# Altium footprint library 集大电协1.5.PcbLib: 273 footprints (part 8 of 18)
Each footprint in its own frame and in the unit in brackets; x right, y up, seen from the top. Pads: shape width x height; smd on the part's side, far side on the other; paste and mask are expansions set on the pad; w line width, h text height; cw(c..) or ccw(c..) is an arc to the next point about the centre after c.
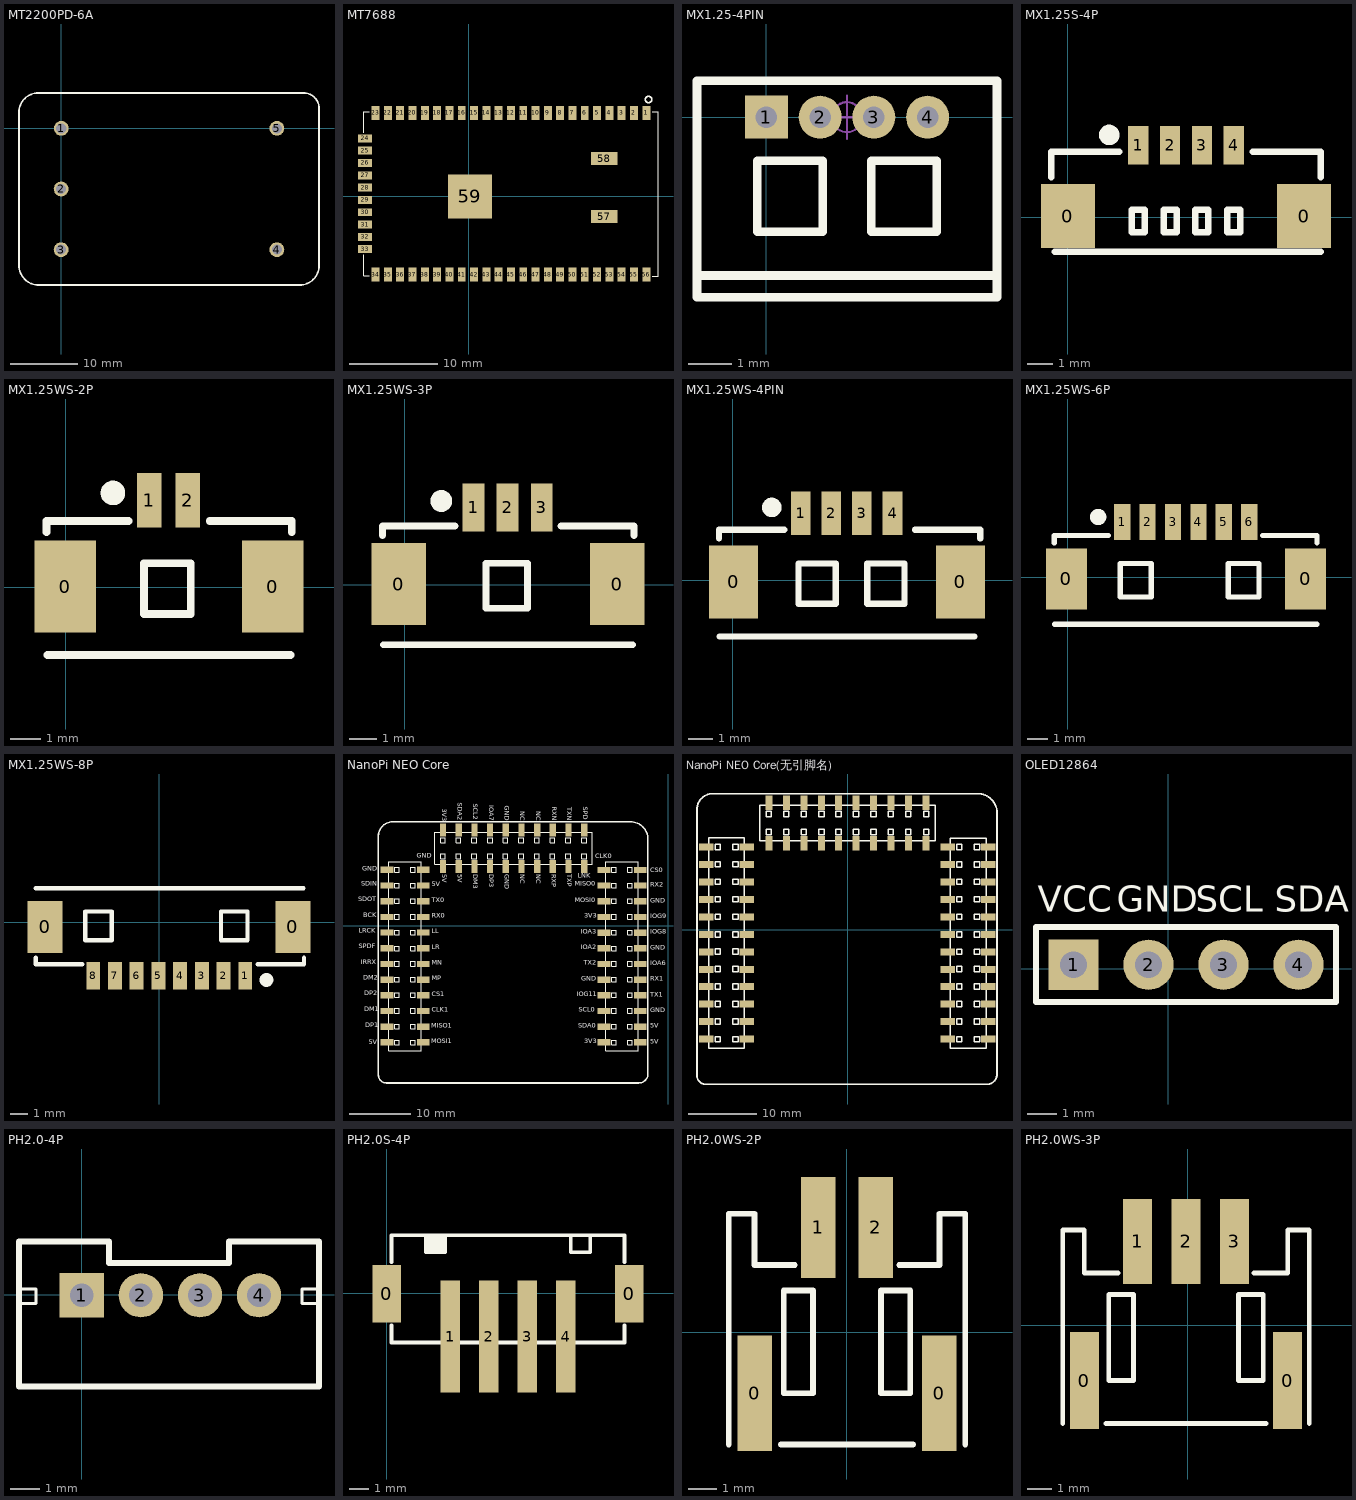
[diagram p7: the footprints below, top view; thin cyan lines are the x and y axes]

## MT2200PD-6A [mm]
pads (5):
  round 2.2 hole 1.5: 1(0.025,0) 2(0,-9) 3(0,-18) 4(32,-18) 5(32,0)
Top Overlay:
  lines w0.254: -6.25,-20.315 ccw(c-3.315,-20.315) -3.315,-23.25 35.382,-23.25 ccw(c35.382,-20.382) 38.25,-20.382 38.25,2.959 ccw(c35.959,2.959) 35.959,5.25 -3.382,5.25 ccw(c-3.382,2.382) -6.25,2.382 -6.25,-20.315
3D body: height 22, standoff 0, extent -6.25,-23.25 38.25,5.25

## MT7688 [mm] "MT7688模组"
pads (59):
  rect 0.9x1.6 smd: 1(20.2,9.49) 2(18.8,9.49) 3(17.4,9.49) 4(16,9.49) 5(14.6,9.49) 6(13.2,9.49) 7(11.8,9.49) 8(10.4,9.49) 9(9,9.49) 10(7.6,9.49) 11(6.2,9.49) 12(4.8,9.49) 13(3.4,9.49) 14(2,9.49) 15(0.6,9.49) 16(-0.8,9.49) 17(-2.2,9.49) 18(-3.6,9.49) 19(-5,9.49) 20(-6.4,9.49) 21(-7.8,9.49) 22(-9.2,9.49) 23(-10.6,9.49) 34(-10.6,-8.91) 35(-9.2,-8.91) 36(-7.8,-8.91) 37(-6.4,-8.91) 38(-5,-8.91) 39(-3.6,-8.91) 40(-2.2,-8.91) 41(-0.8,-8.91) 42(0.6,-8.91) 43(2,-8.91) 44(3.4,-8.91) 45(4.8,-8.91) 46(6.2,-8.91) 47(7.6,-8.91) 48(9,-8.91) 49(10.4,-8.91) 50(11.8,-8.91) 51(13.2,-8.91) 52(14.6,-8.91) 53(16,-8.91) 54(17.4,-8.91) 55(18.8,-8.91) 56(20.2,-8.91)
  rect 1.6x0.9 smd: 24(-11.8,6.59) 25(-11.8,5.19) 26(-11.8,3.79) 27(-11.8,2.39) 28(-11.8,0.99) 29(-11.8,-0.41) 30(-11.8,-1.81) 31(-11.8,-3.21) 32(-11.8,-4.61) 33(-11.8,-6.01)
  rect 3x1.5 smd: 57(15.4,-2.31) 58(15.4,4.29)
  rect 5x5 smd: 59(0.134,-0.01)
Top Overlay:
  circle w0.15: c20.454,11.014 r0.359
  lines w0.1: -11.931,-6.639 -11.931,-9.052 -11.296,-9.052 ; -11.931,7.219 -11.931,9.632 -11.296,9.632 ; 20.896,-9.067 21.531,-9.067 21.531,9.632 20.896,9.632
3D body: height 1, standoff 0, extent -11.95,-9.075 21.525,9.65
3D body "User Library-1909763-1.STEP": height 2, standoff 0.72, extent -11.873,6.65 -9.023,9.65

## MX1.25-4PIN [mm]
pads (4):
  rect 1x1 hole 0.5: 1(0,0)
  round 1 hole 0.5: 2(1.25,0) 3(2.5,0) 4(3.75,0)
Top Overlay:
  lines w0.2: -1.614,-3.683 5.364,-3.683 ; -1.614,-4.191 -1.614,0.85 5.364,0.85 5.364,-4.191 -1.614,-4.191 ; -0.217,-2.667 1.307,-2.667 1.307,-1.016 -0.217,-1.016 -0.217,-2.667 ; 2.443,-2.667 3.967,-2.667 3.967,-1.016 2.443,-1.016 2.443,-2.667
Mechanical 15:
  circle w0.05: c1.875,0 r0.35
  lines w0.05: 1.375,0 2.375,0 ; 1.875,-0.5 1.875,0.5
3D body "MOLEX1.25-WI-4P.STEP": height 3.35, standoff -2.1, extent -1.5,-4.05 5.25,0.85

## MX1.25S-4P [mm]
pads (6):
  rect 2.1x2.5 smd: 0(0.001,0.04) 0(9.237,0.04)
  rect 0.8x1.5 smd: 1(2.744,2.807) 2(3.994,2.807) 3(5.244,2.807) 4(6.494,2.807)
Top Overlay:
  circle w0.4: c1.616,3.215 r0.2
  lines w0.254: -0.662,1.564 -0.662,2.555 2.005,2.555 ; -0.507,-1.357 9.9,-1.357 ; 7.233,2.555 9.9,2.555 9.9,1.564 ; 2.49,-0.595 2.49,0.294 2.998,0.294 2.998,-0.595 2.49,-0.595 ; 3.74,-0.595 4.248,-0.595 4.248,0.294 3.74,0.294 3.74,-0.595 ; 4.99,-0.595 5.498,-0.595 5.498,0.294 4.99,0.294 4.99,-0.595 ; 6.24,-0.595 6.748,-0.595 6.748,0.294 6.24,0.294 6.24,-0.595
3D body "MX 1.25-LS-4P.STEP": height 4.7, standoff 0, extent -0.391,-1.205 9.759,2.895

## MX1.25WS-2P [mm]
pads (4):
  rect 2x3 smd: 0(-0.029,0.025) 0(6.735,0.025)
  rect 0.8x1.778 smd: 1(2.714,2.836) 2(3.964,2.836)
Top Overlay:
  circle w0.4: c1.529,3.073 r0.2
  lines w0.254: -0.63,1.803 -0.63,2.159 2.037,2.159 ; -0.603,-2.203 7.304,-2.203 ; 4.681,2.159 7.348,2.159 7.348,1.803 ; 2.539,-0.864 2.539,0.787 4.063,0.787 4.063,-0.864 2.539,-0.864
3D body "MX 1.25-WS-2P.STEP": height 3.4, standoff 0, extent -0.523,-2.142 7.127,3.048

## MX1.25WS-3P [mm]
pads (5):
  rect 2x3 smd: 0(-0.222,0.025) 0(7.792,0.025)
  rect 0.8x1.778 smd: 1(2.521,2.836) 2(3.771,2.836) 3(5.021,2.836)
Top Overlay:
  circle w0.4: c1.335,3.073 r0.2
  lines w0.254: -0.824,1.803 -0.824,2.159 1.843,2.159 ; -0.797,-2.203 8.36,-2.203 ; 5.738,2.159 8.405,2.159 8.405,1.803 ; 2.971,-0.864 2.971,0.787 4.495,0.787 4.495,-0.864 2.971,-0.864
3D body "MX 1.25-WS-3P.STEP": height 3.4, standoff 0, extent -0.62,-2.087 8.28,3.103

## MX1.25WS-4PIN [mm]
pads (6):
  rect 2x3 smd: 0(0.042,-0.076) 0(9.306,-0.076)
  rect 0.8x1.778 smd: 1(2.785,2.734) 2(4.035,2.734) 3(5.285,2.734) 4(6.535,2.734)
Top Overlay:
  circle w0.4: c1.599,2.972 r0.2
  lines w0.254: -0.56,1.702 -0.56,2.057 2.107,2.057 ; -0.533,-2.304 9.874,-2.304 ; 7.455,2.057 10.122,2.057 10.122,1.702 ; 2.692,-0.965 4.216,-0.965 4.216,0.686 2.692,0.686 2.692,-0.965 ; 5.499,-0.965 5.499,0.686 7.023,0.686 7.023,-0.965 5.499,-0.965
3D body "MX 1.25-WS-4P.STEP": height 3.4, standoff 0, extent -0.473,-2.036 9.677,3.154

## MX1.25WS-6P [mm]
pads (8):
  rect 2x3 smd: 0(-0.065,-0.076) 0(11.699,-0.076)
  rect 0.8x1.778 smd: 1(2.678,2.734) 2(3.928,2.734) 3(5.178,2.734) 4(6.428,2.734) 5(7.678,2.734) 6(8.928,2.734)
Top Overlay:
  circle w0.4: c1.492,2.972 r0.2
  lines w0.254: -0.667,1.702 -0.667,2.057 2,2.057 ; -0.64,-2.304 12.267,-2.304 ; 9.594,2.057 12.261,2.057 12.261,1.702 ; 2.585,-0.965 4.109,-0.965 4.109,0.686 2.585,0.686 2.585,-0.965 ; 7.892,-0.965 9.416,-0.965 9.416,0.686 7.892,0.686 7.892,-0.965
3D body "MX 1.25-WS-6P.STEP": height 3.4, standoff 0, extent -0.432,-2.286 12.218,2.904

## MX1.25WS-8P [mm]
pads (10):
  rect 2x3 smd: 0(-6.564,-0.262) 0(7.7,-0.262)
  rect 0.8x1.6 smd: 1(4.956,-3.072) 2(3.706,-3.072) 3(2.456,-3.072) 4(1.206,-3.072) 5(-0.044,-3.072) 6(-1.294,-3.072) 7(-2.544,-3.072) 8(-3.794,-3.072)
Top Overlay:
  circle w0.4: c6.176,-3.31 r0.2
  lines w0.254: -7.099,1.966 8.308,1.966 ; -7.093,-2.04 -7.093,-2.395 -4.426,-2.395 ; 5.668,-2.395 8.335,-2.395 8.335,-2.04 ; -4.248,-1.024 -2.724,-1.024 -2.724,0.627 -4.248,0.627 -4.248,-1.024 ; 3.559,-1.024 3.559,0.627 5.083,0.627 5.083,-1.024 3.559,-1.024
3D body "MX 1.25-WS-8P.STEP": height 3.4, standoff 0, extent -7.033,-3.445 8.117,1.745

## NanoPi NEO Core [mm]
pads (68):
  rect 2.1x1.02 smd: 1(-45.612,-18.878) 2(-39.712,-18.878) 3(-45.612,-16.338) 4(-39.712,-16.338) 5(-45.612,-13.798) 6(-39.712,-13.798) 7(-45.612,-11.258) 8(-39.712,-11.258) 9(-45.612,-8.718) 10(-39.712,-8.718) 11(-45.612,-6.178) 12(-39.712,-6.178) 13(-45.612,-3.638) 14(-39.712,-3.638) 15(-45.612,-1.098) 16(-39.712,-1.098) 17(-45.612,1.442) 18(-39.712,1.442) 19(-45.612,3.982) 20(-39.712,3.982) 21(-45.612,6.522) 22(-39.712,6.522) 23(-45.612,9.062) 24(-39.712,9.062) 25(-10.45,-18.883) 26(-4.55,-18.883) 27(-10.45,-16.343) 28(-4.55,-16.343) 29(-10.45,-13.803) 30(-4.55,-13.803) 31(-10.45,-11.263) 32(-4.55,-11.263) 33(-10.45,-8.723) 34(-4.55,-8.723) 35(-10.45,-6.183) 36(-4.55,-6.183) 37(-10.45,-3.643) 38(-4.55,-3.643) 39(-10.45,-1.103) 40(-4.55,-1.103) 41(-10.45,1.437) 42(-4.55,1.437) 43(-10.45,3.977) 44(-4.55,3.977) 45(-10.45,6.517) 46(-4.55,6.517) 47(-10.45,9.057) 48(-4.55,9.057)
  rect 1.02x2.1 smd: 49(-13.641,9.625) 50(-13.641,15.525) 51(-16.181,9.625) 52(-16.181,15.525) 53(-18.721,9.625) 54(-18.721,15.525) 55(-21.261,9.625) 56(-21.261,15.525) 57(-23.801,9.625) 58(-23.801,15.525) 59(-26.341,9.625) 60(-26.341,15.525) 61(-28.881,9.625) 62(-28.881,15.525) 63(-31.421,9.625) 64(-31.421,15.525) 65(-33.961,9.625) 66(-33.961,15.525) 67(-36.501,9.625) 68(-36.501,15.525)
Top Overlay:
  drawing of 293 lines, arcs and shapes, not listed
  text "MP" at -38.3,-9.089 h1.27
  text "MN" at -38.3,-6.549 h1.27
  text "LR" at -38.3,-4.009 h1.27
  text "LL" at -38.3,-1.469 h1.27
  text "GND" at -40.775,10.8 h1.27
  text "5V" at -38.3,6.151 h1.27
  text "TX0" at -38.3,3.611 h1.27
  text "RX0" at -38.3,1.071 h1.27
  text "CS0" at -2.942,8.429 h1.27
  text "CLK0" at -11.8,10.675 h1.27
  text "RX2" at -2.942,6.059 h1.27
  text "MISO0" at -15.2,6.225 h1.27
  text "MOSI0" at -15.134,3.586 h1.27
  text "GND" at -2.942,3.519 h1.27
  text "IOG9" at -2.942,0.979 h1.27
  text "IOG8" at -2.942,-1.561 h1.27
  text "GND" at -2.942,-4.101 h1.27
  text "IOA6" at -2.942,-6.641 h1.27
  text "3V3" at -13.66,1.046 h1.27
  text "IOA3" at -14.169,-1.494 h1.27
  text "IOA2" at -14.161,-4.034 h1.27
  text "TX2" at -13.735,-6.574 h1.27
  text "GND" at -14.141,-9.114 h1.27
  text "RX1" at -2.942,-9.181 h1.27
  text "TX1" at -2.942,-11.721 h1.27
  text "GND" at -2.942,-14.261 h1.27
  text "SCL0" at -14.473,-14.194 h1.27
  text "5V" at -2.942,-16.801 h1.27
  text "SDA0" at -14.599,-16.734 h1.27
  text "3V3" at -13.66,-19.274 h1.27
  text "SPD" at -14.04,19.299 h1.27
  text "LNK" at -14.65,7.575 h1.27
  text "TXN" at -16.61,19.228 h1.27
  text "TXP" at -16.592,8.316 h1.27
  text "RXN" at -19.074,19.291 h1.27
  text "RXP" at -19.114,8.316 h1.27
  text "NC" at -21.658,18.585 h1.27
  text "NC" at -21.663,8.316 h1.27
  text "GND" at -26.714,19.479 h1.27
  text "GND" at -26.754,8.316 h1.27
  text "IOA7" at -29.285,19.507 h1.27
  text "DP3" at -29.272,8.316 h1.27
  text "SCL2" at -31.825,19.805 h1.27
  text "DM3" at -31.838,8.316 h1.27
  text "SDA2" at -34.365,19.931 h1.27
  text "5V" at -34.347,8.316 h1.27
  text "3V3" at -36.879,18.998 h1.27
  text "5V" at -36.909,8.316 h1.27
  text "NC" at -24.218,18.585 h1.27
  text "NC" at -24.228,8.316 h1.27
  text "GND" at -49.608,8.709 h1.27
  text "SDIN" at -49.773,6.251 h1.27
  text "SDOT" at -50.284,3.711 h1.27
  text "BCK" at -49.454,1.171 h1.27
  text "LRCK" at -50.147,-1.369 h1.27
  text "SPDF" at -50.13,-3.909 h1.27
  text "IRRX" at -49.804,-6.449 h1.27
  text "DM2" at -49.455,-8.989 h1.27
  text "DP2" at -49.266,-11.529 h1.27
  text "DM1" at -49.306,-14.069 h1.27
  text "DP1" at -49.117,-16.645 h1.27
  text "5V" at -48.539,-19.4 h1.27
  text "MOSI1" at -38.4,-19.289 h1.27
  text "MISO1" at -38.4,-16.8 h1.27
  text "CLK1" at -38.3,-14.205 h1.27
  text "CS1" at -38.3,-11.629 h1.27
  text "5V" at -2.942,-19.341 h1.27
  text "IOG11" at -14.85,-11.625 h1.27
3D body "Fe-Header2X1.STEP": height 5.15, standoff 0, extent -10.802,-4.973 -4.402,-2.373
3D body "Fe-Header2X1.STEP": height 5.15, standoff 0, extent -10.802,-7.513 -4.402,-4.913
3D body "Fe-Header2X1.STEP": height 5.15, standoff 0, extent -10.802,-12.593 -4.402,-9.993
3D body "Fe-Header2X1.STEP": height 5.15, standoff 0, extent -10.802,-10.053 -4.402,-7.453
3D body "Fe-Header2X1.STEP": height 5.15, standoff 0, extent -10.802,-20.213 -4.402,-17.613
3D body "Fe-Header2X1.STEP": height 5.15, standoff 0, extent -10.802,-17.673 -4.402,-15.073
3D body "Fe-Header2X1.STEP": height 5.15, standoff 0, extent -10.802,-15.133 -4.402,-12.533
3D body "Fe-Header2X1.STEP": height 5.15, standoff 0, extent -10.802,2.647 -4.402,5.247
3D body "Fe-Header2X1.STEP": height 5.15, standoff 0, extent -10.802,0.107 -4.402,2.707
3D body "Fe-Header2X1.STEP": height 5.15, standoff 0, extent -10.802,-2.433 -4.402,0.167
3D body "Fe-Header2X1.STEP": height 5.15, standoff 0, extent -10.802,7.727 -4.402,10.327
3D body "Fe-Header2X1.STEP": height 5.15, standoff 0, extent -10.802,5.187 -4.402,7.787
3D body "Fe-Header2X1.STEP": height 5.15, standoff 0, extent -45.964,-4.968 -39.564,-2.368
3D body "Fe-Header2X1.STEP": height 5.15, standoff 0, extent -45.964,-7.508 -39.564,-4.908
3D body "Fe-Header2X1.STEP": height 5.15, standoff 0, extent -45.964,-12.588 -39.564,-9.988
3D body "Fe-Header2X1.STEP": height 5.15, standoff 0, extent -45.964,-10.048 -39.564,-7.448
3D body "Fe-Header2X1.STEP": height 5.15, standoff 0, extent -45.964,-20.208 -39.564,-17.608
3D body "Fe-Header2X1.STEP": height 5.15, standoff 0, extent -45.964,-17.668 -39.564,-15.068
3D body "Fe-Header2X1.STEP": height 5.15, standoff 0, extent -45.964,-15.128 -39.564,-12.528
3D body "Fe-Header2X1.STEP": height 5.15, standoff 0, extent -45.964,2.652 -39.564,5.252
3D body "Fe-Header2X1.STEP": height 5.15, standoff 0, extent -45.964,0.112 -39.564,2.712
3D body "Fe-Header2X1.STEP": height 5.15, standoff 0, extent -45.964,-2.428 -39.564,0.172
3D body "Fe-Header2X1.STEP": height 5.15, standoff 0, extent -45.964,7.732 -39.564,10.332
3D body "Fe-Header2X1.STEP": height 5.15, standoff 0, extent -45.964,5.192 -39.564,7.792
3D body "Fe-Header2X1.STEP": height 5.15, standoff 0, extent -37.771,9.273 -35.171,15.673
3D body "Fe-Header2X1.STEP": height 5.15, standoff 0, extent -32.691,9.273 -30.091,15.673
3D body "Fe-Header2X1.STEP": height 5.15, standoff 0, extent -35.231,9.273 -32.631,15.673
3D body "Fe-Header2X1.STEP": height 5.15, standoff 0, extent -19.991,9.273 -17.391,15.673
3D body "Fe-Header2X1.STEP": height 5.15, standoff 0, extent -17.451,9.273 -14.851,15.673
3D body "Fe-Header2X1.STEP": height 5.15, standoff 0, extent -14.911,9.273 -12.311,15.673
3D body "Fe-Header2X1.STEP": height 5.15, standoff 0, extent -25.071,9.273 -22.471,15.673
3D body "Fe-Header2X1.STEP": height 5.15, standoff 0, extent -22.531,9.273 -19.931,15.673
3D body "Fe-Header2X1.STEP": height 5.15, standoff 0, extent -27.611,9.273 -25.011,15.673
3D body "Fe-Header2X1.STEP": height 5.15, standoff 0, extent -30.151,9.273 -27.551,15.673

## NanoPi NEO Core(无引脚名) [mm]
pads (68):
  rect 2.1x1.02 smd: 1(-20.612,-15.878) 2(-14.712,-15.878) 3(-20.612,-13.338) 4(-14.712,-13.338) 5(-20.612,-10.798) 6(-14.712,-10.798) 7(-20.612,-8.258) 8(-14.712,-8.258) 9(-20.612,-5.718) 10(-14.712,-5.718) 11(-20.612,-3.178) 12(-14.712,-3.178) 13(-20.612,-0.638) 14(-14.712,-0.638) 15(-20.612,1.902) 16(-14.712,1.902) 17(-20.612,4.442) 18(-14.712,4.442) 19(-20.612,6.982) 20(-14.712,6.982) 21(-20.612,9.522) 22(-14.712,9.522) 23(-20.612,12.062) 24(-14.712,12.062) 25(14.55,-15.883) 26(20.45,-15.883) 27(14.55,-13.343) 28(20.45,-13.343) 29(14.55,-10.803) 30(20.45,-10.803) 31(14.55,-8.263) 32(20.45,-8.263) 33(14.55,-5.723) 34(20.45,-5.723) 35(14.55,-3.183) 36(20.45,-3.183) 37(14.55,-0.643) 38(20.45,-0.643) 39(14.55,1.897) 40(20.45,1.897) 41(14.55,4.437) 42(20.45,4.437) 43(14.55,6.977) 44(20.45,6.977) 45(14.55,9.517) 46(20.45,9.517) 47(14.55,12.057) 48(20.45,12.057)
  rect 1.02x2.1 smd: 49(11.359,12.625) 50(11.359,18.525) 51(8.819,12.625) 52(8.819,18.525) 53(6.279,12.625) 54(6.279,18.525) 55(3.739,12.625) 56(3.739,18.525) 57(1.199,12.625) 58(1.199,18.525) 59(-1.341,12.625) 60(-1.341,18.525) 61(-3.881,12.625) 62(-3.881,18.525) 63(-6.421,12.625) 64(-6.421,18.525) 65(-8.961,12.625) 66(-8.961,18.525) 67(-11.501,12.625) 68(-11.501,18.525)
Top Overlay:
  drawing of 293 lines, arcs and shapes, not listed
3D body "Fe-Header2X1.STEP": height 5.15, standoff 0, extent -5.151,12.273 -2.551,18.673
3D body "Fe-Header2X1.STEP": height 5.15, standoff 0, extent -2.611,12.273 -0.011,18.673
3D body "Fe-Header2X1.STEP": height 5.15, standoff 0, extent 2.469,12.273 5.069,18.673
3D body "Fe-Header2X1.STEP": height 5.15, standoff 0, extent -0.071,12.273 2.529,18.673
3D body "Fe-Header2X1.STEP": height 5.15, standoff 0, extent 10.089,12.273 12.689,18.673
3D body "Fe-Header2X1.STEP": height 5.15, standoff 0, extent 7.549,12.273 10.149,18.673
3D body "Fe-Header2X1.STEP": height 5.15, standoff 0, extent 5.009,12.273 7.609,18.673
3D body "Fe-Header2X1.STEP": height 5.15, standoff 0, extent -10.231,12.273 -7.631,18.673
3D body "Fe-Header2X1.STEP": height 5.15, standoff 0, extent -7.691,12.273 -5.091,18.673
3D body "Fe-Header2X1.STEP": height 5.15, standoff 0, extent -12.771,12.273 -10.171,18.673
3D body "Fe-Header2X1.STEP": height 5.15, standoff 0, extent -20.964,8.192 -14.564,10.792
3D body "Fe-Header2X1.STEP": height 5.15, standoff 0, extent -20.964,10.732 -14.564,13.332
3D body "Fe-Header2X1.STEP": height 5.15, standoff 0, extent -20.964,0.572 -14.564,3.172
3D body "Fe-Header2X1.STEP": height 5.15, standoff 0, extent -20.964,3.112 -14.564,5.712
3D body "Fe-Header2X1.STEP": height 5.15, standoff 0, extent -20.964,5.652 -14.564,8.252
3D body "Fe-Header2X1.STEP": height 5.15, standoff 0, extent -20.964,-12.128 -14.564,-9.528
3D body "Fe-Header2X1.STEP": height 5.15, standoff 0, extent -20.964,-14.668 -14.564,-12.068
3D body "Fe-Header2X1.STEP": height 5.15, standoff 0, extent -20.964,-17.208 -14.564,-14.608
3D body "Fe-Header2X1.STEP": height 5.15, standoff 0, extent -20.964,-7.048 -14.564,-4.448
3D body "Fe-Header2X1.STEP": height 5.15, standoff 0, extent -20.964,-9.588 -14.564,-6.988
3D body "Fe-Header2X1.STEP": height 5.15, standoff 0, extent -20.964,-4.508 -14.564,-1.908
3D body "Fe-Header2X1.STEP": height 5.15, standoff 0, extent -20.964,-1.968 -14.564,0.632
3D body "Fe-Header2X1.STEP": height 5.15, standoff 0, extent 14.198,8.187 20.598,10.787
3D body "Fe-Header2X1.STEP": height 5.15, standoff 0, extent 14.198,10.727 20.598,13.327
3D body "Fe-Header2X1.STEP": height 5.15, standoff 0, extent 14.198,0.567 20.598,3.167
3D body "Fe-Header2X1.STEP": height 5.15, standoff 0, extent 14.198,3.107 20.598,5.707
3D body "Fe-Header2X1.STEP": height 5.15, standoff 0, extent 14.198,5.647 20.598,8.247
3D body "Fe-Header2X1.STEP": height 5.15, standoff 0, extent 14.198,-12.133 20.598,-9.533
3D body "Fe-Header2X1.STEP": height 5.15, standoff 0, extent 14.198,-14.673 20.598,-12.073
3D body "Fe-Header2X1.STEP": height 5.15, standoff 0, extent 14.198,-17.213 20.598,-14.613
3D body "Fe-Header2X1.STEP": height 5.15, standoff 0, extent 14.198,-7.053 20.598,-4.453
3D body "Fe-Header2X1.STEP": height 5.15, standoff 0, extent 14.198,-9.593 20.598,-6.993
3D body "Fe-Header2X1.STEP": height 5.15, standoff 0, extent 14.198,-4.513 20.598,-1.913
3D body "Fe-Header2X1.STEP": height 5.15, standoff 0, extent 14.198,-1.973 20.598,0.627

## OLED12864 [mm]
pads (4):
  rect 1.7x1.7 hole 0.9: 1(-3.215,0.14)
  round 1.7 hole 0.9: 2(-0.675,0.14) 3(1.865,0.14) 4(4.405,0.14)
Top Overlay:
  lines w0.2: -4.485,-1.13 -4.485,1.41 5.675,1.41 5.675,-1.13 -4.485,-1.13
  text "VCC" at -4.425,1.65 h1.5
  text "GND" at -1.75,1.65 h1.5
  text "SCL" at 0.925,1.65 h1.5
  text "SDA" at 3.6,1.65 h1.5
3D body "User Library-128x64I2COLEDDisplayAdafruit.step": height 13.47, standoff 2.63, extent -12.8,-25.455 13.9,2.405
3D body "HDR2.54-1P_M.STEP": height 8.5, standoff -3, extent -1.945,-1.13 0.595,1.41
3D body "HDR2.54-1P_M.STEP": height 8.5, standoff -3, extent -4.485,-1.13 -1.945,1.41
3D body "HDR2.54-1P_M.STEP": height 8.5, standoff -3, extent 3.135,-1.13 5.675,1.41
3D body "HDR2.54-1P_M.STEP": height 8.5, standoff -3, extent 0.595,-1.13 3.135,1.41

## PH2.0-4P [mm]
pads (4):
  rect 1.5x1.5 hole 0.8: 1(-0.004,-0.011)
  round 1.5 hole 0.8: 2(1.996,-0.011) 3(3.996,-0.011) 4(5.996,-0.011)
Top Overlay:
  lines w0.1: -2.132,-0.295 -1.552,-0.295 -1.552,0.205 -2.132,0.205 ; 8.028,-0.295 7.448,-0.295 7.448,0.205 8.028,0.205
  lines w0.2: -2.132,1.805 -2.132,-3.095 8.028,-3.095 8.028,1.805 ; 0.916,1.805 0.916,1.089 4.98,1.089 4.98,1.805
  lines w0.203: -2.132,1.805 0.916,1.805 ; 4.98,1.805 8.028,1.805
3D body "PH2.0-LI-4P.STEP": height 6.01, standoff -2.99, extent -1.932,-3.021 7.968,1.679

## PH2.0S-4P [mil]
pads (6):
  rect 59.06x118.11 smd: 0(-0.16,-1.22) 0(497.32,-1.22)
  rect 40x230 smd: 1(130.47,-89.33) 2(209.21,-89.33) 3(287.95,-89.33) 4(366.69,-89.33)
Top Overlay:
  rectangle: 79.84,83.78 119.84,118.78
  lines w7.87: 9.84,-66.22 9.84,-101.22 487.32,-101.22 487.32,-66.22 ; 9.84,63.78 9.84,118.78 487.32,118.78 487.32,63.78 ; 79.84,118.78 79.84,83.78 119.84,83.78 119.84,118.78 ; 377.32,118.78 377.32,83.78 417.32,83.78 417.32,118.78
3D body "PH2.0-LS-4P.STEP": height 242.13, standoff 0, extent 12.36,-190.31 484.8,116.78

## PH2.0WS-2P [mm]
pads (4):
  rect 1.2x4 smd: 0(-3.189,-2.112) 0(3.211,-2.112)
  rect 1.2x3.5 smd: 1(-0.989,3.638) 2(1.011,3.638)
Top Overlay:
  lines w0.2: -4.085,-3.884 -4.085,4.117 -3.196,4.117 -3.196,2.339 -1.799,2.339 ; -2.275,-3.884 2.297,-3.884 ; 1.821,2.339 3.218,2.339 3.218,4.117 4.107,4.117 4.107,-3.884 ; -2.18,-2.106 -2.18,1.45 -1.164,1.45 -1.164,-2.106 -2.18,-2.106 ; 1.186,-2.106 1.186,1.45 2.202,1.45 2.202,-2.106 1.186,-2.106
3D body "PH2.0-LS-2P.STEP": height 6.15, standoff 0, extent -3.973,-3.474 4.027,4.326

## PH2.0WS-3P [mm]
pads (5):
  rect 1.2x4 smd: 0(-4.271,-2.279) 0(4.129,-2.279)
  rect 1.2x3.5 smd: 1(-2.071,3.471) 2(-0.071,3.471) 3(1.929,3.471)
Top Overlay:
  lines w0.2: -5.167,-4.051 -5.167,3.95 -4.278,3.95 -4.278,2.172 -2.881,2.172 ; -3.373,-4.051 3.231,-4.051 ; 2.739,2.172 4.136,2.172 4.136,3.95 5.025,3.95 5.025,-4.051 ; -3.262,-2.273 -3.262,1.283 -2.246,1.283 -2.246,-2.273 -3.262,-2.273 ; 2.104,-2.273 2.104,1.283 3.12,1.283 3.12,-2.273 2.104,-2.273
3D body "PH2.0-LS-3P.STEP": height 6.15, standoff 0, extent -5.166,-3.514 4.834,4.286